# Altium footprint library Hydra_Ref_pcb.PcbLib: 353 footprints (part 4 of 23) (continued)
## Coax_Top-Mid3 [mil] "PCB Coaxial Transition"
height 100
via 0,0 diameter 27.98 hole 12
via 47.22,29.35 diameter 24.98 hole 12
via 28.33,47.84 diameter 24.98 hole 12
via 3.04,55.52 diameter 24.98 hole 12
via -22.94,50.65 diameter 24.98 hole 12
via -43.73,34.34 diameter 24.98 hole 12
via -43.73,-34.34 diameter 24.98 hole 12
via -22.94,-50.65 diameter 24.98 hole 12
via 3.04,-55.52 diameter 24.98 hole 12
via 28.33,-47.84 diameter 24.98 hole 12
via 47.22,-29.35 diameter 24.98 hole 12
Top Layer:
  pour cut-out: -30.41,30.41 -33.4,27.41 -38.11,20.37 -41.35,12.54 -43,4.23 -43,-4.24 -41.35,-12.54 -38.11,-20.37 -33.4,-27.41 -30.41,-30.41 -27.41,-33.4 -20.37,-38.11 -12.54,-41.35 -4.24,-43 4.24,-43 12.54,-41.35 20.37,-38.11 27.41,-33.4 30.41,-30.41 33.4,-27.41 38.11,-20.37 41.35,-12.54 43,-4.24 43,4.23 41.35,12.54 38.11,20.37 33.4,27.41 30.41,30.41 27.41,33.4 20.37,38.11 12.54,41.35 4.24,43 -4.24,43 -12.54,41.35 -20.37,38.11 -27.41,33.4
  pour cut-out: -58.41,19 26.24,19 26.24,-19 -58.41,-19
Mid-Layer 1:
  pour cut-out: -30.41,30.41 -33.4,27.41 -38.11,20.37 -41.35,12.54 -43,4.23 -43,-4.24 -41.35,-12.54 -38.11,-20.37 -33.4,-27.41 -30.41,-30.41 -27.41,-33.4 -20.37,-38.11 -12.54,-41.35 -4.24,-43 4.24,-43 12.54,-41.35 20.37,-38.11 27.41,-33.4 30.41,-30.41 33.4,-27.41 38.11,-20.37 41.35,-12.54 43,-4.24 43,4.23 41.35,12.54 38.11,20.37 33.4,27.41 30.41,30.41 27.41,33.4 20.37,38.11 12.54,41.35 4.24,43 -4.24,43 -12.54,41.35 -20.37,38.11 -27.41,33.4
MidLayer3:
  pour cut-out: -30.41,30.41 -33.4,27.41 -38.11,20.37 -41.35,12.54 -43,4.23 -43,-4.24 -41.35,-12.54 -38.11,-20.37 -33.4,-27.41 -30.41,-30.41 -27.41,-33.4 -20.37,-38.11 -12.54,-41.35 -4.24,-43 4.24,-43 12.54,-41.35 20.37,-38.11 27.41,-33.4 30.41,-30.41 33.4,-27.41 38.11,-20.37 41.35,-12.54 43,-4.24 43,4.23 41.35,12.54 38.11,20.37 33.4,27.41 30.41,30.41 27.41,33.4 20.37,38.11 12.54,41.35 4.24,43 -4.24,43 -12.54,41.35 -20.37,38.11 -27.41,33.4
MidLayer2:
  pour cut-out: -30.41,30.41 -33.4,27.41 -38.11,20.37 -41.35,12.54 -43,4.23 -43,-4.24 -41.35,-12.54 -38.11,-20.37 -33.4,-27.41 -30.41,-30.41 -27.41,-33.4 -20.37,-38.11 -12.54,-41.35 -4.24,-43 4.24,-43 12.54,-41.35 20.37,-38.11 27.41,-33.4 30.41,-30.41 33.4,-27.41 38.11,-20.37 41.35,-12.54 43,-4.24 43,4.23 41.35,12.54 38.11,20.37 33.4,27.41 30.41,30.41 27.41,33.4 20.37,38.11 12.54,41.35 4.24,43 -4.24,43 -12.54,41.35 -20.37,38.11 -27.41,33.4
MidLayer4:
  pour cut-out: -30.41,30.41 -33.4,27.41 -38.11,20.37 -41.35,12.54 -43,4.23 -43,-4.24 -41.35,-12.54 -38.11,-20.37 -33.4,-27.41 -30.41,-30.41 -27.41,-33.4 -20.37,-38.11 -12.54,-41.35 -4.24,-43 4.24,-43 12.54,-41.35 20.37,-38.11 27.41,-33.4 30.41,-30.41 33.4,-27.41 38.11,-20.37 41.35,-12.54 43,-4.24 43,4.23 41.35,12.54 38.11,20.37 33.4,27.41 30.41,30.41 27.41,33.4 20.37,38.11 12.54,41.35 4.24,43 -4.24,43 -12.54,41.35 -20.37,38.11 -27.41,33.4
Mid-Layer 5:
  pour cut-out: -30.41,30.41 -33.4,27.41 -38.11,20.37 -41.35,12.54 -43,4.23 -43,-4.24 -41.35,-12.54 -38.11,-20.37 -33.4,-27.41 -30.41,-30.41 -27.41,-33.4 -20.37,-38.11 -12.54,-41.35 -4.24,-43 4.24,-43 12.54,-41.35 20.37,-38.11 27.41,-33.4 30.41,-30.41 33.4,-27.41 38.11,-20.37 41.35,-12.54 43,-4.24 43,4.23 41.35,12.54 38.11,20.37 33.4,27.41 30.41,30.41 27.41,33.4 20.37,38.11 12.54,41.35 4.24,43 -4.24,43 -12.54,41.35 -20.37,38.11 -27.41,33.4
Mid-Layer 6:
  pour cut-out: -30.41,30.41 -33.4,27.41 -38.11,20.37 -41.35,12.54 -43,4.23 -43,-4.24 -41.35,-12.54 -38.11,-20.37 -33.4,-27.41 -30.41,-30.41 -27.41,-33.4 -20.37,-38.11 -12.54,-41.35 -4.24,-43 4.24,-43 12.54,-41.35 20.37,-38.11 27.41,-33.4 30.41,-30.41 33.4,-27.41 38.11,-20.37 41.35,-12.54 43,-4.24 43,4.23 41.35,12.54 38.11,20.37 33.4,27.41 30.41,30.41 27.41,33.4 20.37,38.11 12.54,41.35 4.24,43 -4.24,43 -12.54,41.35 -20.37,38.11 -27.41,33.4
Bottom Layer:
  pour cut-out: -30.41,-30.41 -27.41,-33.4 -20.37,-38.11 -12.54,-41.35 -4.23,-43 4.24,-43 12.54,-41.35 20.37,-38.11 27.41,-33.4 30.41,-30.41 33.4,-27.41 38.11,-20.37 41.35,-12.54 43,-4.23 43,4.24 41.35,12.54 38.11,20.37 33.4,27.41 30.41,30.41 27.41,33.4 20.37,38.11 12.54,41.35 4.24,43 -4.23,43 -12.54,41.35 -20.37,38.11 -27.41,33.4 -30.4,30.41 -33.4,27.41 -38.11,20.37 -41.35,12.54 -43,4.24 -43,-4.23 -41.35,-12.54 -38.11,-20.37 -33.4,-27.41
Top Solder:
  region: -30.41,30.41 -33.4,27.41 -38.11,20.37 -41.35,12.54 -43,4.23 -43,-4.24 -41.35,-12.54 -38.11,-20.37 -33.4,-27.41 -30.41,-30.41 -27.41,-33.4 -20.37,-38.11 -12.54,-41.35 -4.24,-43 4.24,-43 12.54,-41.35 20.37,-38.11 27.41,-33.4 30.41,-30.41 33.4,-27.41 38.11,-20.37 41.35,-12.54 43,-4.24 43,4.23 41.35,12.54 38.11,20.37 33.4,27.41 30.41,30.41 27.41,33.4 20.37,38.11 12.54,41.35 4.24,43 -4.24,43 -12.54,41.35 -20.37,38.11 -27.41,33.4
Bottom Solder:
  region: -30.41,30.41 -33.4,27.41 -38.11,20.37 -41.35,12.54 -43,4.23 -43,-4.24 -41.35,-12.54 -38.11,-20.37 -33.4,-27.41 -30.41,-30.41 -27.41,-33.4 -20.37,-38.11 -12.54,-41.35 -4.24,-43 4.24,-43 12.54,-41.35 20.37,-38.11 27.41,-33.4 30.41,-30.41 33.4,-27.41 38.11,-20.37 41.35,-12.54 43,-4.24 43,4.23 41.35,12.54 38.11,20.37 33.4,27.41 30.41,30.41 27.41,33.4 20.37,38.11 12.54,41.35 4.24,43 -4.24,43 -12.54,41.35 -20.37,38.11 -27.41,33.4
Internal Plane 1:
  circle w0.5: c0,0 r27
  region: 0,-27 -2.66,-27 -7.88,-25.96 -12.79,-23.93 -17.21,-20.97 -20.97,-17.21 -23.93,-12.79 -25.96,-7.88 -27,-2.66 -27,0 -27,2.66 -25.96,7.88 -23.93,12.79 -20.97,17.21 -17.21,20.97 -12.79,23.93 -7.88,25.96 -2.66,27 0,27 2.66,27 7.88,25.96 12.79,23.93 17.21,20.97 20.97,17.21 23.93,12.79 25.96,7.88 27,2.66 27,0 27,-2.66 25.96,-7.88 23.93,-12.79 20.97,-17.21 17.21,-20.97 12.79,-23.93 7.88,-25.96 2.66,-27
InternalPlane 3:
  circle w0.5: c0,0 r28.5
  region: 0,-28.5 -2.81,-28.5 -8.31,-27.4 -13.5,-25.26 -18.17,-22.14 -22.14,-18.17 -25.26,-13.5 -27.4,-8.31 -28.5,-2.81 -28.5,0 -28.5,2.81 -27.4,8.31 -25.26,13.5 -22.14,18.17 -18.17,22.14 -13.5,25.26 -8.31,27.4 -2.81,28.5 0,28.5 2.81,28.5 8.31,27.4 13.5,25.26 18.17,22.14 22.14,18.17 25.26,13.5 27.4,8.31 28.5,2.81 28.5,0 28.5,-2.81 27.4,-8.31 25.26,-13.5 22.14,-18.17 18.17,-22.14 13.5,-25.26 8.31,-27.4 2.81,-28.5
Internal Plane 2:
  circle w0.5: c0,0 r43
  region: 0,-43 -4.24,-43 -12.54,-41.35 -20.37,-38.11 -27.41,-33.4 -33.4,-27.41 -38.11,-20.37 -41.35,-12.54 -43,-4.24 -43,0 -43,4.24 -41.35,12.54 -38.11,20.37 -33.4,27.41 -27.41,33.4 -20.37,38.11 -12.54,41.35 -4.24,43 0,43 4.24,43 12.54,41.35 20.37,38.11 27.41,33.4 33.4,27.41 38.11,20.37 41.35,12.54 43,4.24 43,0 43,-4.24 41.35,-12.54 38.11,-20.37 33.4,-27.41 27.41,-33.4 20.37,-38.11 12.54,-41.35 4.24,-43
Internal Plane 4:
  circle w0.5: c0,0 r43
  region: 0,-43 -4.24,-43 -12.54,-41.35 -20.37,-38.11 -27.41,-33.4 -33.4,-27.41 -38.11,-20.37 -41.35,-12.54 -43,-4.24 -43,0 -43,4.24 -41.35,12.54 -38.11,20.37 -33.4,27.41 -27.41,33.4 -20.37,38.11 -12.54,41.35 -4.24,43 0,43 4.24,43 12.54,41.35 20.37,38.11 27.41,33.4 33.4,27.41 38.11,20.37 41.35,12.54 43,4.24 43,0 43,-4.24 41.35,-12.54 38.11,-20.37 33.4,-27.41 27.41,-33.4 20.37,-38.11 12.54,-41.35 4.24,-43
9 Top Assy:
  text ".Designator" at -36,-8 h15
13 Top 3D Bodies:
  circle w2: c0,0 r43
Mechanical 30:
  circle w2: c0,0 r43
3D body: height 30, standoff 0, extent -42.98,-42.98 42.98,42.98

## CONN-2367-0000-54 [mm] "STRAIGHT OSMT PCB MOUNT PLUG RECEPTACLE -AMP"
height 2.2
pads (4):
  rect 1.2x2.75 smd paste-0.508 mask-0.508: 1(0,-1.375)
  rect 1x1.2 smd paste-25.4 mask-25.4: 2(-2,0) 3(2,0)
  rect 1.2x1.5 smd paste-25.4 mask-25.4: 4(0,2)
Top Layer:
  pour cut-out: -1.245,-0.864 -1.245,0.864 -2.769,0.864 -2.769,-0.864
  pour cut-out: 2.755,-0.864 2.755,0.864 1.231,0.864 1.231,-0.864
  pour cut-out: 0.864,0.991 0.864,3.023 -0.864,3.023 -0.864,0.991
Top Overlay:
  circle w0.8: c1.3,-2.8 r0.1
  lines w0.127: -2.125,-0.75 -2.125,-2.125 -1.875,-2.375 -0.75,-2.375 ; -2.125,0.725 -2.125,2.125 -1.875,2.375 -0.75,2.375 ; 0.75,-2.375 1.9,-2.375 2.125,-2.15 2.125,-0.75 ; 0.75,2.375 1.875,2.375 2.125,2.125 2.125,0.75
9 Top Assy:
  circle w0.051: c0,0 r0.6
  lines w0.051: -2,-1.786 2,-1.786 ; -2,-0.5 -2.25,-0.5 -2.25,0.5 -2,0.5 ; -0.5,-2.25 -0.5,-2.5 0.5,-2.5 0.5,-2.25 ; -0.5,2.25 -0.5,2.5 0.5,2.5 0.5,2.25 ; 2,-0.5 2.25,-0.5 2.25,0.5 2,0.5 ; -2,-2.075 -1.825,-2.25 1.825,-2.25 2,-2.075 2,2.05 1.8,2.25 -1.8,2.25 -2,2.05 -2,-2.075
  text ".Designator" at -1.778,0.889 h1.02
22 Part Dimentions & Info:
  lines w0.051: -2,-0.5 -1.5,-0.5 -1.5,0.5 -2,0.5 ; -0.5,-2.25 -0.5,0.25 0.5,0.25 0.5,-2.25 ; -0.5,2.25 -0.5,1.25 0.5,1.25 0.5,2.25 ; 2,-0.5 1.5,-0.5 1.5,0.5 2,0.5
3D body: height 2.2, standoff 0, extent -2.8,-3 2.8,3

## CONN-3211-60035 [mil] "SMPM MALE 1 PORT EDGE MOUNT - SV Microwave, Inc"
height 70.5
pads (5):
  rect 14.96x75 smd: 1(0,-37.5)
  rect 32.5x60 smd: 2(-78.75,135) 2(78.75,135)
  rect 20x20 smd paste-1000 mask-1000: 2(-60,-30) 2(65,-25)
via 112.5,56.15 diameter 28 hole 14
via 139.5,9.38 diameter 28 hole 14
via 126,32.77 diameter 28 hole 14
via 99,32.77 diameter 28 hole 14
via 112.5,9.38 diameter 28 hole 14
via -139.5,-37.38 diameter 28 hole 14
via -139.5,9.38 diameter 28 hole 14
via -126,32.77 diameter 28 hole 14
via -112.5,56.15 diameter 28 hole 14
via -99,32.77 diameter 28 hole 14
via -112.5,9.38 diameter 28 hole 14
via 45,-14 diameter 28 hole 14
via 72,-14 diameter 28 hole 14
via 99,-14 diameter 28 hole 14
via 58.5,-37.38 diameter 28 hole 14
via 85.5,-37.38 diameter 28 hole 14
via 45,-60.77 diameter 28 hole 14
via 72,-60.77 diameter 28 hole 14
via 99,-60.77 diameter 28 hole 14
via 112.5,-37.38 diameter 28 hole 14
via 126,-14 diameter 28 hole 14
via 126,-60.77 diameter 28 hole 14
via 58.5,-84.15 diameter 28 hole 14
via 85.5,-84.15 diameter 28 hole 14
via 112.5,-84.15 diameter 28 hole 14
via 139.5,-84.15 diameter 28 hole 14
via 72,-107.53 diameter 28 hole 14
via 99,-107.53 diameter 28 hole 14
via 126,-107.53 diameter 28 hole 14
via 58.5,-130.91 diameter 28 hole 14
via 85.5,-130.91 diameter 28 hole 14
via 112.5,-130.91 diameter 28 hole 14
via 139.5,-130.91 diameter 28 hole 14
via -139.5,-130.91 diameter 28 hole 14
via -112.5,-130.91 diameter 28 hole 14
via -85.5,-130.91 diameter 28 hole 14
via -58.5,-130.91 diameter 28 hole 14
via -126,-107.53 diameter 28 hole 14
via -99,-107.53 diameter 28 hole 14
via -72,-107.53 diameter 28 hole 14
via -139.5,-84.15 diameter 28 hole 14
via -112.5,-84.15 diameter 28 hole 14
via -85.5,-84.15 diameter 28 hole 14
via -58.5,-84.15 diameter 28 hole 14
via -126,-60.77 diameter 28 hole 14
via -126,-14 diameter 28 hole 14
via -112.5,-37.38 diameter 28 hole 14
via -99,-60.77 diameter 28 hole 14
via -72,-60.77 diameter 28 hole 14
via -45,-60.77 diameter 28 hole 14
via -85.5,-37.38 diameter 28 hole 14
via -58.5,-37.38 diameter 28 hole 14
via -99,-14 diameter 28 hole 14
via -72,-14 diameter 28 hole 14
via -45,-14 diameter 28 hole 14
via 139.5,-37.38 diameter 28 hole 14
Top Layer:
  pour cut-out: -61.94,0 -65.03,0 -70.72,2.36 -75.08,6.72 -77.44,12.42 -77.44,18.58 -75.08,24.28 -70.72,28.64 -65.03,31 -61.94,31 -61.94,165 63.06,165 63.06,31 66.14,31 71.84,28.64 76.2,24.28 78.56,18.58 78.56,12.42 76.2,6.72 71.84,2.36 66.14,0 63.06,0
  region: -95.37,-75.37 -95.4,-75.33 -95.46,-75.25 -95.5,-75.15 -95.52,-75.05 -95.52,-75 -95.52,60 -95.52,60.05 -95.5,60.15 -95.46,60.25 -95.4,60.33 -95.37,60.37 -95.33,60.4 -95.25,60.46 -95.15,60.5 -95.05,60.52 -95,60.52 -62.5,60.52 -62.4,60.52 -62.21,60.44 -62.06,60.3 -61.98,60.11 -61.98,60 -61.98,31 -61.98,30.9 -62.06,30.71 -62.21,30.56 -62.4,30.49 -62.5,30.49 -65.42,30.2 -70.83,27.96 -74.96,23.83 -77.2,18.42 -77.2,12.58 -74.96,7.18 -70.83,3.04 -65.42,0.8 -62.5,0.52 -62.41,0.52 -62.25,0.46 -62.11,0.35 -62.02,0.21 -62,0.12 -61.98,0.21 -61.89,0.35 -61.75,0.46 -61.59,0.52 -61.5,0.52 -45,0.52 -44.95,0.52 -44.85,0.5 -44.75,0.46 -44.67,0.4 -44.63,0.37 -44.6,0.33 -44.54,0.25 -44.5,0.15 -44.48,0.05 -44.48,0 -44.48,-75 -44.48,-75.05 -44.5,-75.15 -44.54,-75.25 -44.6,-75.33 -44.63,-75.37 -44.67,-75.4 -44.75,-75.46 -44.85,-75.5 -44.95,-75.52 -45,-75.52 -95,-75.52 -95.05,-75.52 -95.15,-75.5 -95.25,-75.46 -95.33,-75.4
  region: 45,-75 95,-75 95,60 62.5,60 62.5,31 65.52,30.7 71.11,28.39 75.39,24.11 77.7,18.52 77.7,12.48 75.39,6.89 71.11,2.61 65.52,0.3 62.5,0 45,0
Mid-Layer 1:
  pour cut-out: -61.94,0 -65.03,0 -70.72,2.36 -75.08,6.72 -77.44,12.42 -77.44,18.58 -75.08,24.28 -70.72,28.64 -65.03,31 -61.94,31 -61.94,165 63.06,165 63.06,31 66.14,31 71.84,28.64 76.2,24.28 78.56,18.58 78.56,12.42 76.2,6.72 71.84,2.36 66.14,0 63.06,0
MidLayer3:
  pour cut-out: -61.94,0 -65.03,0 -70.72,2.36 -75.08,6.72 -77.44,12.42 -77.44,18.58 -75.08,24.28 -70.72,28.64 -65.03,31 -61.94,31 -61.94,165 63.06,165 63.06,31 66.14,31 71.84,28.64 76.2,24.28 78.56,18.58 78.56,12.42 76.2,6.72 71.84,2.36 66.14,0 63.06,0
MidLayer2:
  pour cut-out: -61.94,0 -65.03,0 -70.72,2.36 -75.08,6.72 -77.44,12.42 -77.44,18.58 -75.08,24.28 -70.72,28.64 -65.03,31 -61.94,31 -61.94,165 63.06,165 63.06,31 66.14,31 71.84,28.64 76.2,24.28 78.56,18.58 78.56,12.42 76.2,6.72 71.84,2.36 66.14,0 63.06,0
Bottom Layer:
  pour cut-out: -61.94,0 -65.03,0 -70.72,2.36 -75.08,6.72 -77.44,12.42 -77.44,18.58 -75.08,24.28 -70.72,28.64 -65.03,31 -61.94,31 -61.94,165 63.06,165 63.06,31 66.14,31 71.84,28.64 76.2,24.28 78.56,18.58 78.56,12.42 76.2,6.72 71.84,2.36 66.14,0 63.06,0
Top Overlay:
  lines w5: -77.5,70 -77.5,95 ; -35,-10 -17.5,-10 ; 17.5,-10 35,-10 ; 77.5,70 77.5,95
Top Paste:
  region: -62.5,60 -62.5,47 -67.08,46.55 -75.56,43.04 -82.04,36.56 -85.55,28.08 -86,23.5 -85.55,18.92 -82.04,10.44 -75.56,3.96 -67.08,0.45 -62.5,0 -45,0 -45,-75 -95,-75 -95,60
  region: 62.5,60 62.5,47 67.08,46.55 75.56,43.04 82.04,36.56 85.55,28.09 86,23.5 85.55,18.92 82.04,10.44 75.56,3.96 67.08,0.45 62.5,0 45,0 45,-75 95,-75 95,60
Top Solder:
  rectangle: -90.5,-3 -58.5,48
  rectangle: 58.5,-5.5 90,45.5
  rectangle: -31,-79 31,4
  region: 58.5,64 58.5,43.5 62.5,43.5 66.4,43.12 73.61,40.13 79.13,34.61 82.12,27.4 82.5,23.5 82.13,19.7 79.21,12.67 73.83,7.29 66.8,4.37 63,4 41,4 41,-79 99,-79 99,64
  region: -58.5,64 -58.5,43.5 -62,43.5 -65.9,43.12 -73.11,40.13 -78.63,34.61 -81.62,27.4 -82,23.5 -81.63,19.7 -78.71,12.67 -73.33,7.29 -66.3,4.37 -62.5,4 -41,4 -41,-79 -99,-79 -99,64
Internal Plane 1:
  pour cut-out: -61.94,0 -65.03,0 -70.72,2.36 -75.08,6.72 -77.44,12.42 -77.44,18.58 -75.08,24.28 -70.72,28.64 -65.03,31 -61.94,31 -61.94,165 63.06,165 63.06,31 66.14,31 71.84,28.64 76.2,24.28 78.56,18.58 78.56,12.42 76.2,6.72 71.84,2.36 66.14,0 63.06,0
9 Top Assy:
  lines w2: -78.5,0 78.5,0 ; -62.5,0 -62.5,166 ; -62.5,43 -78.5,43 -78.5,-56 -47.5,-56 -47.5,0 ; -62.5,123 -78.5,123 -78.5,166 60,166 78.5,166 78.5,123 62.5,123 ; -50,166 -50,0 60,0 ; -6,0 -6,-56 6,-56 6,0 ; 47.5,0 47.5,-56 78.5,-56 78.5,43 62.5,43 ; 50,0 50,166 ; 62.5,0 62.5,166
  text ".Designator" at 15,13 h40
3D body: height 70, standoff 0, extent -78.48,0.02 78.48,164.98
3D body: height 0, standoff -55, extent -60,0 60,165
3D body: height 14.49, standoff 2.51, extent -5.95,-56 6,0
3D body: height 12, standoff 0, extent 47.52,-55.98 78.48,-0.02
3D body: height 12, standoff 0, extent -78.48,-55.98 -47.52,-0.02

## CONN-3211-60035-031 [mil] "SMPM MALE 1 PORT EDGE MOUNT - SV Microwave, Inc"
height 70
pads (5):
  rect 14.96x75 smd: 1(0,-37.5)
  rect 32.5x60 smd: 2(-78.75,135) 2(78.75,135)
  rect 20x20 smd paste-1000 mask-1000: 2(-60,-30) 2(65,-25)
via -110,138.62 diameter 28 hole 14
via -84,138.62 diameter 28 hole 14
via -97,116.1 diameter 28 hole 14
via -110,93.58 diameter 28 hole 14
via -84,93.58 diameter 28 hole 14
via -97,71.07 diameter 28 hole 14
via -123,71.07 diameter 28 hole 14
via -110,48.55 diameter 28 hole 14
via -84,48.55 diameter 28 hole 14
via -123,26.03 diameter 28 hole 14
via -97,26.03 diameter 28 hole 14
via -110,3.52 diameter 28 hole 14
via -45,-19 diameter 28 hole 14
via -71,-19 diameter 28 hole 14
via -97,-19 diameter 28 hole 14
via -123,-19 diameter 28 hole 14
via -58,-41.52 diameter 28 hole 14
via -84,-41.52 diameter 28 hole 14
via -110,-41.52 diameter 28 hole 14
via -45,-64.03 diameter 28 hole 14
via -71,-64.03 diameter 28 hole 14
via -97,-64.03 diameter 28 hole 14
via -123,-64.03 diameter 28 hole 14
via -58,-86.55 diameter 28 hole 14
via -84,-86.55 diameter 28 hole 14
via -110,-86.55 diameter 28 hole 14
via -71,-109.07 diameter 28 hole 14
via -97,-109.07 diameter 28 hole 14
via -58,-131.58 diameter 28 hole 14
via -84,-131.58 diameter 28 hole 14
via -110,-131.58 diameter 28 hole 14
via -123,-109.07 diameter 28 hole 14
via -71,-154.1 diameter 28 hole 14
via -97,-154.1 diameter 28 hole 14
via -123,-154.1 diameter 28 hole 14
via 123,-154.1 diameter 28 hole 14
via 97,-154.1 diameter 28 hole 14
via 71,-154.1 diameter 28 hole 14
via 123,-109.07 diameter 28 hole 14
via 110,-131.58 diameter 28 hole 14
via 84,-131.58 diameter 28 hole 14
via 58,-131.58 diameter 28 hole 14
via 97,-109.07 diameter 28 hole 14
via 71,-109.07 diameter 28 hole 14
via 110,-86.55 diameter 28 hole 14
via 84,-86.55 diameter 28 hole 14
via 58,-86.55 diameter 28 hole 14
via 123,-64.03 diameter 28 hole 14
via 97,-64.03 diameter 28 hole 14
via 71,-64.03 diameter 28 hole 14
via 45,-64.03 diameter 28 hole 14
via 110,-41.52 diameter 28 hole 14
via 84,-41.52 diameter 28 hole 14
via 58,-41.52 diameter 28 hole 14
via 123,-19 diameter 28 hole 14
via 97,-19 diameter 28 hole 14
via 71,-19 diameter 28 hole 14
via 45,-19 diameter 28 hole 14
via 110,3.52 diameter 28 hole 14
via 97,26.03 diameter 28 hole 14
via 123,26.03 diameter 28 hole 14
via 84,48.55 diameter 28 hole 14
via 110,48.55 diameter 28 hole 14
via 123,71.07 diameter 28 hole 14
via 97,71.07 diameter 28 hole 14
via 84,93.58 diameter 28 hole 14
via 110,93.58 diameter 28 hole 14
via 97,116.1 diameter 28 hole 14
via 84,138.62 diameter 28 hole 14
via 110,138.62 diameter 28 hole 14
Top Layer:
  rectangle: 62.5,44.88 95,135
  region: -62.5,135 -95,135 -95,44.88 -62.5,44.88
  region: 62.5,60.59 62.5,31.37 65.52,31.08 71.11,28.77 75.39,24.49 77.7,18.91 78,15.89 78,15.86 77.71,12.88 75.43,7.38 71.21,3.17 65.71,0.89 62.73,0.59 45,0.59 45,-74.41 95,-74.41 95,60.59
  region: -62.5,60.59 -62.52,31.37 -65.54,31.07 -71.12,28.76 -75.39,24.49 -77.7,18.91 -78,15.89 -78,15.86 -77.71,12.88 -75.43,7.38 -71.21,3.17 -65.71,0.89 -62.73,0.59 -45,0.59 -45,-74.41 -95,-74.41 -95,60.59
  pour cut-out: -78.75,135 -78.75,165 78.75,165 78.75,105 95,105 95,-75 -95,-75 -95,135
Top Overlay:
  lines w5: -103,-13.12 -103,164.7 ; 103,-10 103,167.83
Top Paste:
  region: -62.5,60 -62.52,30.78 -65.54,30.48 -71.12,28.17 -75.39,23.9 -77.7,18.32 -78,15.29 -78,15.27 -77.71,12.29 -75.43,6.79 -71.21,2.57 -65.71,0.29 -62.73,0 -45,0 -45,-75 -95,-75 -95,60
  region: 62.5,60 62.5,30.78 65.52,30.48 71.11,28.17 75.39,23.9 77.7,18.32 78,15.29 78,15.27 77.71,12.29 75.43,6.79 71.21,2.57 65.71,0.29 62.73,0 45,0 45,-75 95,-75 95,60
Top Solder:
  region: -58.5,167.83 -99,167.83 -99,-5.5 -58.5,-5.5
  region: 99,4 41,4 41,-79 99,-79
  rectangle: -99,-79 -41,4
  rectangle: 58.5,-5.5 99,167.83
  rectangle: -31,-79 31,4
9 Top Assy:
  lines w2: -78.5,0 78.5,0 ; -62.5,0 -62.5,166 ; -62.5,43 -78.5,43 -78.5,-56 -47.5,-56 -47.5,0 ; -62.5,123 -78.5,123 -78.5,166 60,166 78.5,166 78.5,123 62.5,123 ; -50,166 -50,0 60,0 ; -6,0 -6,-56 6,-56 6,0 ; 47.5,0 47.5,-56 78.5,-56 78.5,43 62.5,43 ; 50,0 50,166 ; 62.5,0 62.5,166
  text ".Designator" at 15,13 h40
3D body: height 70, standoff 0, extent -78.48,0.02 78.48,164.98
3D body: height 0, standoff -55, extent -60,0 60,165
3D body: height 14.49, standoff 2.51, extent -5.95,-56 6,0
3D body: height 12, standoff 0, extent 47.52,-55.98 78.48,-0.02
3D body: height 12, standoff 0, extent -78.48,-55.98 -47.52,-0.02

## CONN-3211-60035_plane_cutout [mil] "SMPM MALE 1 PORT EDGE MOUNT - SV Microwave, Inc"
height 70
pads (5):
  rect 14.96x75 smd: 1(0,-37.5)
  rect 32.5x60 smd: 2(-78.75,135) 2(78.75,135)
  rect 20x20 smd paste-1000 mask-1000: 2(-60,-30) 2(65,-25)
via -45,-61.5 diameter 28 hole 12
via -70.11,-47 diameter 28 hole 12
via -45,-32.5 diameter 28 hole 12
via -70.11,-18 diameter 28 hole 12
via -70.11,-76 diameter 28 hole 12
via -95.23,-61.5 diameter 28 hole 12
via -95.23,-32.5 diameter 28 hole 12
via -95.23,-3.5 diameter 28 hole 12
via -95.23,-90.5 diameter 28 hole 12
via 95.23,-90.5 diameter 28 hole 12
via 95.23,-3.5 diameter 28 hole 12
via 95.23,-32.5 diameter 28 hole 12
via 95.23,-61.5 diameter 28 hole 12
via 70.11,-76 diameter 28 hole 12
via 70.11,-18 diameter 28 hole 12
via 45,-32.5 diameter 28 hole 12
via 70.11,-47 diameter 28 hole 12
via 45,-61.5 diameter 28 hole 12
Top Layer:
  rectangle: 31,-61.5 45,-32.5
  region: -31,-32.5 -45,-32.5 -45,-61.5 -31,-61.5
  region: -95.37,-75.37 -95.4,-75.33 -95.46,-75.25 -95.5,-75.15 -95.52,-75.05 -95.52,-75 -95.52,60 -95.52,60.05 -95.5,60.15 -95.46,60.25 -95.4,60.33 -95.37,60.37 -95.33,60.4 -95.25,60.46 -95.15,60.5 -95.05,60.52 -95,60.52 -62.5,60.52 -62.4,60.52 -62.21,60.44 -62.06,60.3 -61.98,60.11 -61.98,60 -61.98,31 -61.98,30.9 -62.06,30.71 -62.21,30.56 -62.4,30.49 -62.5,30.49 -65.42,30.2 -70.83,27.96 -74.96,23.83 -77.2,18.42 -77.2,12.58 -74.96,7.18 -70.83,3.04 -65.42,0.8 -62.5,0.52 -62.41,0.52 -62.25,0.46 -62.11,0.35 -62.02,0.21 -62,0.12 -61.98,0.21 -61.89,0.35 -61.75,0.46 -61.59,0.52 -61.5,0.52 -45,0.52 -44.95,0.52 -44.85,0.5 -44.75,0.46 -44.67,0.4 -44.63,0.37 -44.6,0.33 -44.54,0.25 -44.5,0.15 -44.48,0.05 -44.48,0 -44.48,-75 -44.48,-75.05 -44.5,-75.15 -44.54,-75.25 -44.6,-75.33 -44.63,-75.37 -44.67,-75.4 -44.75,-75.46 -44.85,-75.5 -44.95,-75.52 -45,-75.52 -95,-75.52 -95.05,-75.52 -95.15,-75.5 -95.25,-75.46 -95.33,-75.4
  region: 45,-75 95,-75 95,60 62.5,60 62.5,31 65.52,30.7 71.11,28.39 75.39,24.11 77.7,18.52 77.7,12.48 75.39,6.89 71.11,2.61 65.52,0.3 62.5,0 45,0
  pour cut-out: -61.94,0 -65.03,0 -70.72,2.36 -75.08,6.72 -77.44,12.42 -77.44,18.58 -75.08,24.28 -70.72,28.64 -65.03,31 -61.94,31 -61.94,165 63.06,165 63.06,31 66.14,31 71.84,28.64 76.2,24.28 78.56,18.58 78.56,12.42 76.2,6.72 71.84,2.36 66.14,0 63.06,0
Mid-Layer 1:
  pour cut-out: -61.94,0 -65.03,0 -70.72,2.36 -75.08,6.72 -77.44,12.42 -77.44,18.58 -75.08,24.28 -70.72,28.64 -65.03,31 -61.94,31 -61.94,165 63.06,165 63.06,31 66.14,31 71.84,28.64 76.2,24.28 78.56,18.58 78.56,12.42 76.2,6.72 71.84,2.36 66.14,0 63.06,0
MidLayer3:
  pour cut-out: -61.94,0 -65.03,0 -70.72,2.36 -75.08,6.72 -77.44,12.42 -77.44,18.58 -75.08,24.28 -70.72,28.64 -65.03,31 -61.94,31 -61.94,165 63.06,165 63.06,31 66.14,31 71.84,28.64 76.2,24.28 78.56,18.58 78.56,12.42 76.2,6.72 71.84,2.36 66.14,0 63.06,0
MidLayer2:
  pour cut-out: -61.94,0 -65.03,0 -70.72,2.36 -75.08,6.72 -77.44,12.42 -77.44,18.58 -75.08,24.28 -70.72,28.64 -65.03,31 -61.94,31 -61.94,165 63.06,165 63.06,31 66.14,31 71.84,28.64 76.2,24.28 78.56,18.58 78.56,12.42 76.2,6.72 71.84,2.36 66.14,0 63.06,0
Bottom Layer:
  pour cut-out: -61.94,0 -65.03,0 -70.72,2.36 -75.08,6.72 -77.44,12.42 -77.44,18.58 -75.08,24.28 -70.72,28.64 -65.03,31 -61.94,31 -61.94,165 63.06,165 63.06,31 66.14,31 71.84,28.64 76.2,24.28 78.56,18.58 78.56,12.42 76.2,6.72 71.84,2.36 66.14,0 63.06,0
Top Paste:
  drawing of 2 lines, arcs and shapes, not listed
Top Solder:
  rectangle: -31,-79 31,4
  rectangle: 58.5,-5.5 90,45.5
  rectangle: -90.5,-3 -58.5,48
  region: -58.5,64 -58.5,43.5 -62,43.5 -65.9,43.12 -73.11,40.13 -78.63,34.61 -81.62,27.4 -82,23.5 -81.63,19.7 -78.71,12.67 -73.33,7.29 -66.3,4.37 -62.5,4 -41,4 -41,-79 -99,-79 -99,64
  region: 58.5,64 58.5,43.5 62.5,43.5 66.4,43.12 73.61,40.13 79.13,34.61 82.12,27.4 82.5,23.5 82.13,19.7 79.21,12.67 73.83,7.29 66.8,4.37 63,4 41,4 41,-79 99,-79 99,64
Internal Plane 1:
  pour cut-out: -61.94,0 -65.03,0 -70.72,2.36 -75.08,6.72 -77.44,12.42 -77.44,18.58 -75.08,24.28 -70.72,28.64 -65.03,31 -61.94,31 -61.94,165 63.06,165 63.06,31 66.14,31 71.84,28.64 76.2,24.28 78.56,18.58 78.56,12.42 76.2,6.72 71.84,2.36 66.14,0 63.06,0
9 Top Assy:
  lines w2: -78.5,0 78.5,0 ; -62.5,0 -62.5,166 ; -62.5,43 -78.5,43 -78.5,-56 -47.5,-56 -47.5,0 ; -62.5,123 -78.5,123 -78.5,166 60,166 78.5,166 78.5,123 62.5,123 ; -50,166 -50,0 60,0 ; -6,0 -6,-56 6,-56 6,0 ; 47.5,0 47.5,-56 78.5,-56 78.5,43 62.5,43 ; 50,0 50,166 ; 62.5,0 62.5,166
  text ".Designator" at 15,13 h40
3D body: height 70, standoff 0, extent -78.48,0.02 78.48,164.98
3D body: height 0, standoff -55, extent -60,0 60,165
3D body: height 14.49, standoff 2.51, extent -5.95,-56 6,0
3D body: height 12, standoff 0, extent 47.52,-55.98 78.48,-0.02
3D body: height 12, standoff 0, extent -78.48,-55.98 -47.52,-0.02